# Altium footprint library PcbLib1.PcbLib: 69 footprints (part 2 of 5)
Each footprint in its own frame and in the unit in brackets; x right, y up, seen from the top. Pads: shape width x height; smd on the part's side, far side on the other; paste and mask are expansions set on the pad; w line width, h text height; cw(c..) or ccw(c..) is an arc to the next point about the centre after c.
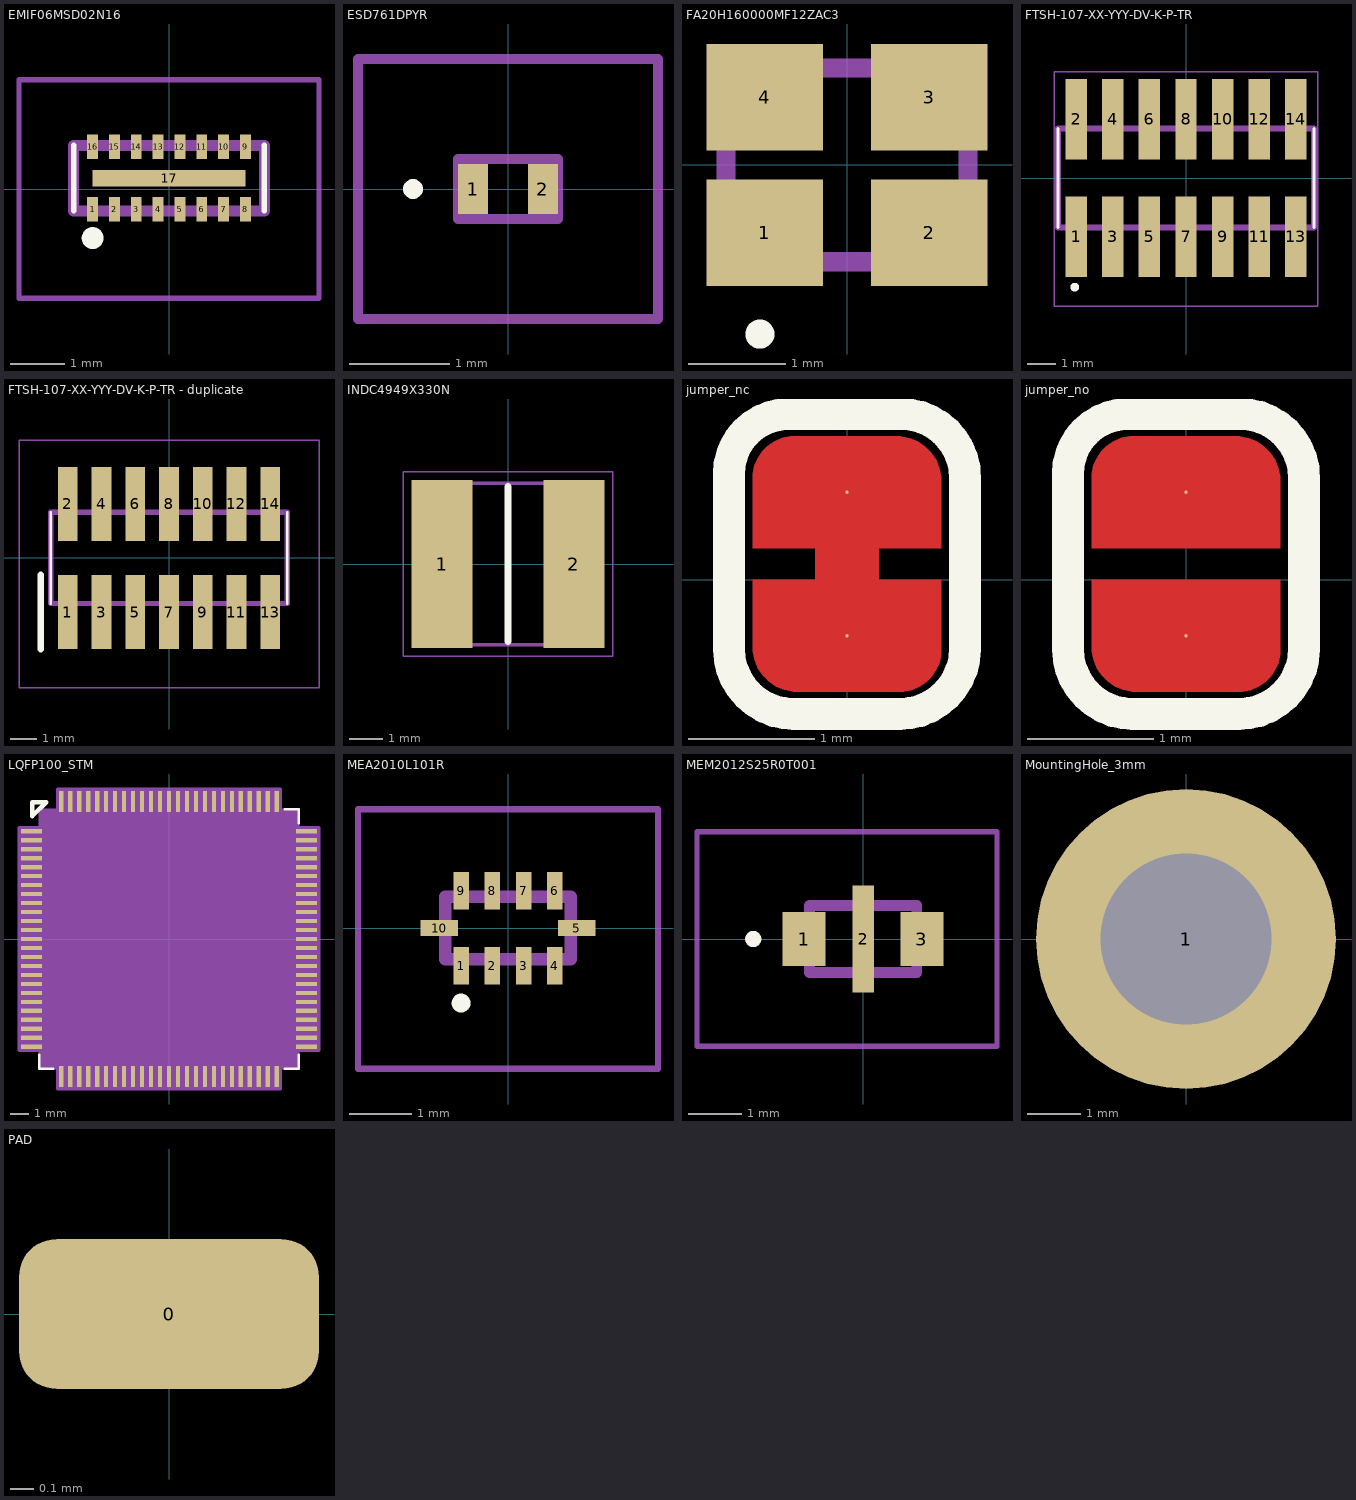
[diagram p1: the footprints below, top view; thin cyan lines are the x and y axes]

## EMIF06MSD02N16 [mm]
pads (17):
  rect 0.2x0.45 smd: 1(-1.4,-0.375) 2(-1,-0.375) 3(-0.6,-0.375) 4(-0.2,-0.375) 5(0.2,-0.375) 6(0.6,-0.375) 7(1,-0.375) 8(1.4,-0.375) 9(1.4,0.775) 10(1,0.775) 11(0.6,0.775) 12(0.2,0.775) 13(-0.2,0.775) 14(-0.6,0.775) 15(-1,0.775) 16(-1.4,0.775)
  rect 2.8x0.3 smd: 17(0,0.2)
Top Overlay:
  lines w0.1: -1.75,-0.4 -1.75,0.8 ; 1.75,-0.4 1.75,0.8
  lines w0.2: -1.5,-0.9 cw(c-1.4,-0.9) -1.3,-0.9 cw(c-1.4,-0.9) -1.5,-0.9
Mechanical 13:
  lines w0.2: -1.75,-0.4 1.75,-0.4 1.75,0.8 -1.75,0.8 -1.75,-0.4
Mechanical 15:
  lines w0.1: -2.75,-2 2.75,-2 2.75,2 -2.75,2 -2.75,-2
3D body "EMIF06-MSD02N16.stp": height 0.55, standoff 0, extent -1.75,-0.41 1.75,0.79

## ESD761DPYR [mm]
pads (2):
  rect 0.3x0.5 smd: 1(-0.35,0) 2(0.35,0)
Top Overlay:
  lines w0.1: -1,0 cw(c-0.95,0) -0.9,0 cw(c-0.95,0) -1,0
Mechanical 13:
  lines w0.1: -0.5,-0.3 -0.5,0.3 0.5,0.3 0.5,-0.3 -0.5,-0.3
Mechanical 15:
  lines w0.1: -1.5,-1.3 -1.5,1.3 1.5,1.3 1.5,-1.3 -1.5,-1.3
3D body "ESD761DPYR.stp": height 0.55, standoff 0, extent -0.5,-0.3 0.5,0.3

## FA20H160000MF12ZAC3 [mm]
pads (4):
  rect 1.2x1.1 smd: 1(-0.85,-0.7) 2(0.85,-0.7) 3(0.85,0.7) 4(-0.85,0.7)
Top Overlay:
  lines w0.2: -0.9,-1.8 ccw(c-0.9,-1.75) -0.9,-1.7 ; -0.9,-1.8 cw(c-0.9,-1.75) -0.9,-1.7 ; -0.9,-1.8 ccw(c-0.9,-1.75) -0.9,-1.7
Mechanical 13:
  lines w0.2: -1.25,-1 -1.25,1 1.25,1 1.25,-1 -1.25,-1
3D body "FA-20H_25.0000MD30Y-C0.stp": height 0.63, standoff 0, extent -1.25,-1 1.25,1

## FTSH-107-XX-YYY-DV-K-P-TR [mm]
pads (14):
  rect 0.74x2.79 smd: 1(-3.81,-2.035) 2(-3.81,2.035) 3(-2.54,-2.035) 4(-2.54,2.035) 5(-1.27,-2.035) 6(-1.27,2.035) 7(0,-2.035) 8(0,2.035) 9(1.27,-2.035) 10(1.27,2.035) 11(2.54,-2.035) 12(2.54,2.035) 13(3.81,-2.035) 14(3.81,2.035)
Top Overlay:
  circle w0.2: c-3.86,-3.785 r0.05
  lines w0.1: -4.445,-1.715 -4.445,1.715 ; 4.445,-1.715 4.445,1.715
Mechanical 13:
  lines w0.2: -4.445,-1.715 -4.445,1.715 4.445,1.715 4.445,-1.715 -4.445,-1.715
Mechanical 15:
  lines w0.05: -4.572,-4.445 4.572,-4.445 4.572,3.683 -4.572,3.683 -4.572,-4.445
3D body "FTSH-107-01-F-DV-K-P-TR.stp": height 6.99, standoff 0, extent -4.445,-4.425 4.445,2.941

## FTSH-107-XX-YYY-DV-K-P-TR - duplicate [mm]
pads (14):
  rect 0.74x2.79 smd: 1(-3.81,-2.035) 2(-3.81,2.035) 3(-2.54,-2.035) 4(-2.54,2.035) 5(-1.27,-2.035) 6(-1.27,2.035) 7(0,-2.035) 8(0,2.035) 9(1.27,-2.035) 10(1.27,2.035) 11(2.54,-2.035) 12(2.54,2.035) 13(3.81,-2.035) 14(3.81,2.035)
Top Overlay:
  lines w0.1: -4.445,-1.715 -4.445,1.715 ; 4.445,-1.715 4.445,1.715
  lines w0.254: -4.826,-3.429 -4.826,-0.635
Mechanical 13:
  lines w0.2: -4.445,-1.715 -4.445,1.715 4.445,1.715 4.445,-1.715 -4.445,-1.715
Mechanical 15:
  lines w0.05: -5.645,-4.885 -5.645,4.43 5.645,4.43 5.645,-4.885 -5.645,-4.885
3D body "FTSH-107-01-F-DV-K-P-TR.stp": height 6.99, standoff 0, extent -4.445,-4.425 4.445,2.941

## INDC4949X330N [mm]
pads (2):
  rect 1.85x5.1 smd: 1(-2,0) 2(2,0)
Top Overlay:
  lines w0.2: 0,-2.35 0,2.35
Mechanical 13:
  lines w0.1: -2.45,-2.45 2.45,-2.45 2.45,2.45 -2.45,2.45 -2.45,-2.45
Mechanical 15:
  lines w0.05: -3.175,-2.8 3.175,-2.8 3.175,2.8 -3.175,2.8 -3.175,-2.8
3D body "NRS5030T3R3MMGJ.stp": height 3.3, standoff 0, extent -2.45,-2.45 2.45,2.45

## jumper_nc [mil]
pads (2):
  round 1 smd: 1(0,27.5) 2(0,-17.5)
Top Layer:
  region: -10,-10 -10,20 10,20 10,-10
  region: 29.5,10 -29.5,10 -29.5,32 -29.5,33.28 -29,35.79 -28.02,38.16 -26.6,40.29 -24.79,42.1 -22.66,43.52 -20.29,44.5 -17.78,45 -16.5,45 15.5,45 16.88,45 19.58,44.46 22.13,43.41 24.42,41.87 26.37,39.92 27.91,37.63 28.96,35.08 29.5,32.38 29.5,31
  region: -29.5,0 29.5,0 29.5,-22 29.5,-23.28 29,-25.79 28.02,-28.16 26.6,-30.29 24.79,-32.1 22.66,-33.52 20.29,-34.5 17.78,-35 16.5,-35 -15.5,-35 -16.88,-35 -19.58,-34.46 -22.13,-33.41 -24.42,-31.87 -26.37,-29.92 -27.91,-27.63 -28.96,-25.08 -29.5,-22.38 -29.5,-21
Top Overlay:
  lines w10: -37,5 -37,-21.63 ccw(c-16.63,-21.63) -16.63,-42 16.51,-42 ccw(c16.51,-21.51) 37,-21.51 37,32 ccw(c17,32) 17,52 -18.25,52 ccw(c-18.25,33.25) -37,33.25 -37,6

## jumper_no [mil]
pads (2):
  round 1 smd: 1(0,27.5) 2(0,-17.5)
Top Layer:
  region: 29.5,10 -29.5,10 -29.5,32 -29.5,33.28 -29,35.79 -28.02,38.16 -26.6,40.29 -24.79,42.1 -22.66,43.52 -20.29,44.5 -17.78,45 -16.5,45 15.5,45 16.88,45 19.58,44.46 22.13,43.41 24.42,41.87 26.37,39.92 27.91,37.63 28.96,35.08 29.5,32.38 29.5,31
  region: -29.5,0 29.5,0 29.5,-22 29.5,-23.28 29,-25.79 28.02,-28.16 26.6,-30.29 24.79,-32.1 22.66,-33.52 20.29,-34.5 17.78,-35 16.5,-35 -15.5,-35 -16.88,-35 -19.58,-34.46 -22.13,-33.41 -24.42,-31.87 -26.37,-29.92 -27.91,-27.63 -28.96,-25.08 -29.5,-22.38 -29.5,-21
Top Overlay:
  lines w10: -37,5 -37,-21.63 ccw(c-16.63,-21.63) -16.63,-42 16.51,-42 ccw(c16.51,-21.51) 37,-21.51 37,32 ccw(c17,32) 17,52 -18.25,52 ccw(c-18.25,33.25) -37,33.25 -37,6

## LQFP100_STM [mil]
pads (100):
  rect 46x9 smd paste+0 mask+0: 1(-302,236.22) 2(-302,216.54) 3(-302,196.85) 4(-302,177.17) 5(-302,157.48) 6(-302,137.8) 7(-302,118.11) 8(-302,98.43) 9(-302,78.74) 10(-302,59.06) 11(-302,39.37) 12(-302,19.69) 13(-302,0) 14(-302,-19.68) 15(-302,-39.37) 16(-302,-59.06) 17(-302,-78.74) 18(-302,-98.43) 19(-302,-118.11) 20(-302,-137.8) 21(-302,-157.48) 22(-302,-177.17) 23(-302,-196.85) 24(-302,-216.54) 25(-302,-236.22) 51(302,-236.22) 52(302,-216.54) 53(302,-196.85) 54(302,-177.17) 55(302,-157.48) 56(302,-137.8) 57(302,-118.11) 58(302,-98.43) 59(302,-78.74) 60(302,-59.06) 61(302,-39.37) 62(302,-19.68) 63(302,0) 64(302,19.68) 65(302,39.37) 66(302,59.06) 67(302,78.74) 68(302,98.43) 69(302,118.11) 70(302,137.8) 71(302,157.48) 72(302,177.17) 73(302,196.85) 74(302,216.54) 75(302,236.22)
  rect 9x46 smd paste+0 mask+0: 26(-236.22,-302) 27(-216.54,-302) 28(-196.85,-302) 29(-177.17,-302) 30(-157.48,-302) 31(-137.8,-302) 32(-118.11,-302) 33(-98.43,-302) 34(-78.74,-302) 35(-59.06,-302) 36(-39.37,-302) 37(-19.68,-302) 38(0,-302) 39(19.68,-302) 40(39.37,-302) 41(59.06,-302) 42(78.74,-302) 43(98.43,-302) 44(118.11,-302) 45(137.8,-302) 46(157.48,-302) 47(177.17,-302) 48(196.85,-302) 49(216.54,-302) 50(236.22,-302) 76(236.22,302) 77(216.54,302) 78(196.85,302) 79(177.17,302) 80(157.48,302) 81(137.8,302) 82(118.11,302) 83(98.43,302) 84(78.74,302) 85(59.06,302) 86(39.37,302) 87(19.68,302) 88(0,302) 89(-19.68,302) 90(-39.37,302) 91(-59.06,302) 92(-78.74,302) 93(-98.43,302) 94(-118.11,302) 95(-137.8,302) 96(-157.48,302) 97(-177.17,302) 98(-196.85,302) 99(-216.54,302) 100(-236.22,302)
Top Overlay:
  lines w6: -300,269.66 -300,300.34 -269.32,300.34 ; -284.5,-253.82 -284.5,-284.5 -253.82,-284.5 ; 253.82,-284.5 284.5,-284.5 284.5,-253.82 ; 253.82,284.5 284.5,284.5 284.5,253.82
  lines w10: -300,269.66 -269.32,300.34 -300,300.34 -300,269.66
Mechanical 13:
  drawing of 405 lines, arcs and shapes, not listed
  text "*" at -277,221.06 h50
Mechanical 15:
  region: -244.72,-283.5 -283.5,-283.5 -283.5,-244.72 -329,-244.72 -329,244.72 -283.5,244.72 -283.5,283.5 -244.72,283.5 -244.72,329 244.72,329 244.72,283.5 283.5,283.5 283.5,244.72 329,244.72 329,-244.72 283.5,-244.72 283.5,-283.5 244.72,-283.5 244.72,-329 -244.72,-329
  lines w6: -329,-244.72 -329,244.72 -283.5,244.72 -283.5,283.5 -244.72,283.5 -244.72,329 244.72,329 244.72,283.5 283.5,283.5 283.5,244.72 329,244.72 329,-244.72 283.5,-244.72 283.5,-283.5 244.72,-283.5 244.72,-329 -244.72,-329 -244.72,-283.5 -283.5,-283.5 -283.5,-244.72 -329,-244.72
3D body "LQFP100_STM.step": height 63.11, standoff 0, extent -319.02,-319.02 319.02,319.02

## MEA2010L101R [mm]
pads (10):
  rect 0.25x0.6 smd: 1(-0.75,-0.6) 2(-0.25,-0.6) 3(0.25,-0.6) 4(0.75,-0.6) 6(0.75,0.6) 7(0.25,0.6) 8(-0.25,0.6) 9(-0.75,0.6)
  rect 0.6x0.25 smd: 5(1.1,0) 10(-1.1,0)
Top Overlay:
  lines w0.2: -0.8,-1.2 ccw(c-0.75,-1.2) -0.7,-1.2 ; -0.8,-1.2 cw(c-0.75,-1.2) -0.7,-1.2 ; -0.8,-1.2 ccw(c-0.75,-1.2) -0.7,-1.2
Mechanical 13:
  lines w0.2: -1,-0.5 -1,0.5 1,0.5 1,-0.5 -1,-0.5
Mechanical 15:
  lines w0.1: -2.4,-2.25 -2.4,1.9 2.4,1.9 2.4,-2.25 -2.4,-2.25
3D body "MEA2010L101R.stp": height 0.9, standoff 0, extent -1.375,-0.875 1.375,0.875

## MEM2012S25R0T001 [mm]
pads (3):
  rect 0.8x1 smd: 1(-1.1,0) 3(1.1,0)
  rect 0.4x2 smd: 2(0,0)
Top Overlay:
  lines w0.2: -2.1,0 cw(c-2.05,0) -2,0 cw(c-2.05,0) -2.1,0
Mechanical 13:
  lines w0.2: -1,-0.625 1,-0.625 1,0.625 -1,0.625 -1,-0.625
Mechanical 15:
  lines w0.1: -3.1,-2 2.5,-2 2.5,2 -3.1,2 -3.1,-2
3D body "MEM2012S25R0T001.stp": height 1, standoff 0, extent -1,-0.625 1,0.625

## MountingHole_3mm [mm]
pads (1):
  round 5.6 hole 3.2: 1(0,0)

## PAD [mm]
pads (1):
  rrect50% 1.27x0.635 smd: 0(0,0)

## PCBComponent_1 [mm]

## PCBComponent_1 - duplicate [mm]

## PCBComponent_1 - duplicate1 [mm]